# Altium footprint library mastermind.PCBLIB: 1061 footprints (part 30 of 67)
Each footprint in its own frame and in the unit in brackets; x right, y up, seen from the top. Pads: shape width x height; smd on the part's side, far side on the other; paste and mask are expansions set on the pad; w line width, h text height; cw(c..) or ccw(c..) is an arc to the next point about the centre after c.
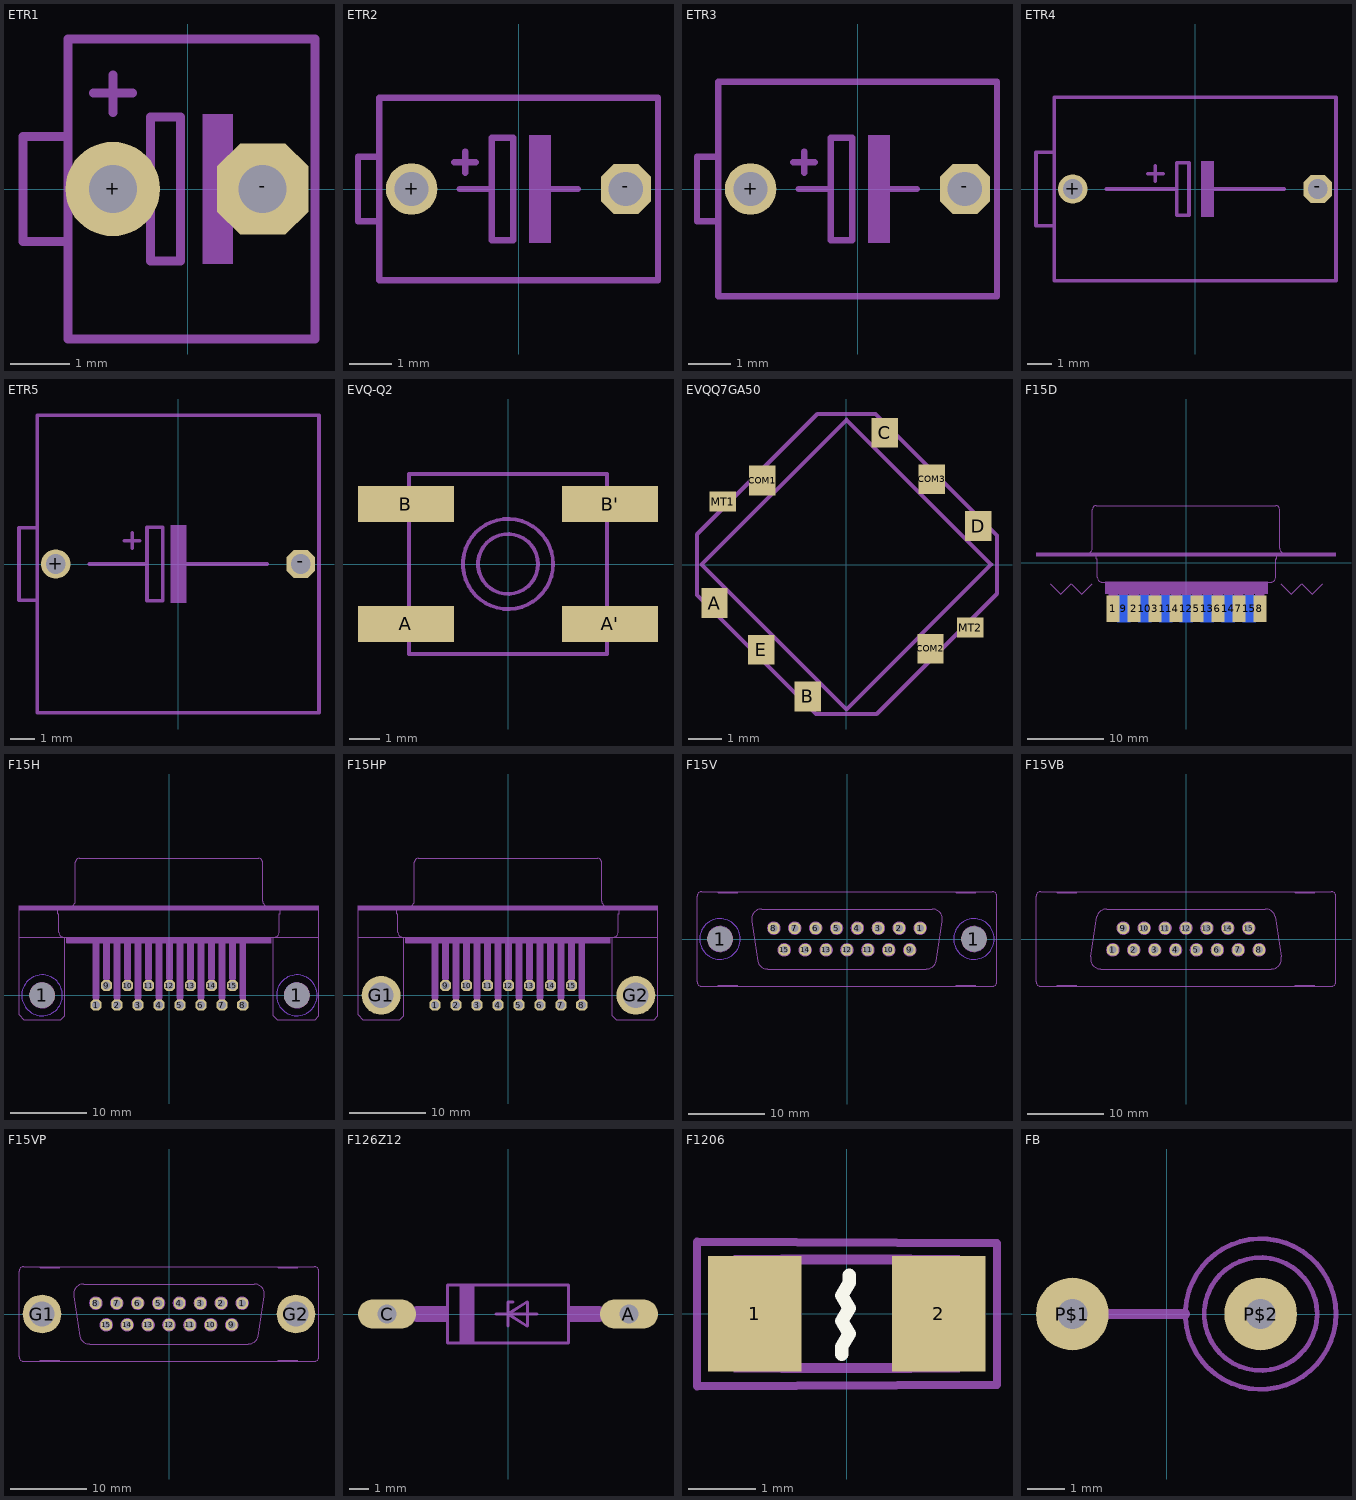
[diagram p29: the footprints below, top view; thin cyan lines are the x and y axes]

## ETR1 [mil]
pads (2):
  round 63 hole 32: +(-50,0)
  oct 61x61 hole 32: -(50,0)
Mechanical 2:
  lines w6: -63,64 -37,64 ; -50,51 -50,76 ; 85,-25 85,-100 -80,-100 -80,-35 -110,-35 -110,35 -80,35 -80,100 85,100 85,25
Mechanical 8:
  region: 10,-50 10,50 30,50 30,-50
  lines w6: -80,-35 -80,35 ; -65,0 -25,0 ; 25,0 65,0 ; 85,-25 85,25 ; -25,0 -25,48 -5,48 -5,-48 -25,-48 -25,0

## ETR2 [mil]
pads (2):
  round 48 hole 32: +(-100,0)
  oct 46.48x46.48 hole 32: -(100,0)
Mechanical 2:
  region: 10,-50 10,50 30,50 30,-50
  lines w6: -60,25 -40,25 ; -55,0 -25,0 ; -50,15 -50,35 ; 25,0 55,0 ; 130,-30 130,-85 -130,-85 -130,-30 -150,-30 -150,30 -130,30 -130,85 130,85 130,30 ; -25,0 -25,48 -5,48 -5,-48 -25,-48 -25,0
Mechanical 8:
  lines w6: -130,-30 -130,30 ; 130,-30 130,30

## ETR3 [mil]
pads (2):
  round 48 hole 32: +(-100,0)
  oct 46.48x46.48 hole 32: -(100,0)
Mechanical 2:
  region: 10,-50 10,50 30,50 30,-50
  lines w6: -60,25 -40,25 ; -55,0 -25,0 ; -50,15 -50,35 ; 25,0 55,0 ; 130,-30 130,-100 -130,-100 -130,-30 -150,-30 -150,30 -130,30 -130,100 130,100 130,30 ; -25,0 -25,48 -5,48 -5,-48 -25,-48 -25,0
Mechanical 8:
  lines w6: -130,-30 -130,30 ; 130,-30 130,30

## ETR4 [mil]
pads (2):
  round 48 hole 32: +(-200,0)
  oct 46.48x46.48 hole 32: -(200,0)
Mechanical 2:
  region: 10,-45 10,45 30,45 30,-45
  lines w6: -145,0 -30,0 ; -77,25 -52,25 ; -65,13 -65,38 ; 20,0 145,0 ; 230,-30 230,-150 -230,-150 -230,-60 -260,-60 -260,60 -230,60 -230,150 230,150 230,30 ; -30,0 -30,-43 -10,-43 -10,43 -30,43 -30,0
Mechanical 8:
  lines w6: -230,-60 -230,60 ; 230,-30 230,30

## ETR5 [mil]
pads (2):
  round 48 hole 32: +(-200,0)
  oct 46.48x46.48 hole 32: -(200,0)
Mechanical 2:
  region: -12,-63 -12,63 13,63 13,-63
  lines w6: -145,0 -51,0 ; -88,38 -63,38 ; -75,26 -75,51 ; 0,0 145,0 ; 230,-35 230,-243 -230,-243 -230,-59 -260,-59 -260,59 -230,59 -230,243 230,243 230,35 ; -51,0 -51,-60 -25,-60 -25,60 -51,60 -51,0
Mechanical 8:
  lines w6: -230,-59 -230,59 ; 230,-35 230,35

## EVQ-Q2 [mm]
pads (4):
  rect 3.2x1.2 smd: A(-3.4,-2) A'(3.4,-2) B(-3.4,2) B'(3.4,2)
Mechanical 2:
  circle w0.127: c0,0 r1.503
  circle w0.127: c0,0 r1
  lines w0.127: -3.3,-3 3.3,-3 3.3,3 -3.3,3 -3.3,-3

## EVQQ7GA50 [mil]
pads (10):
  rect 31.5x35.43 smd: A(-157.29,-45.93) B(-45.93,-157.29) C(45.93,157.29) COM1(-100.22,100.22) COM2(100.22,-100.22) COM3(101.61,101.61) D(157.29,45.93) E(-101.61,-101.61)
  rect 31.5x23.62 smd: MT1(-147.54,75.16) MT2(147.54,-75.16)
Mechanical 2:
  lines w5: -178.17,-36.19 -36.19,-178.17 36.19,-178.17 179.56,-34.8 179.56,34.8 34.8,179.56 -34.8,179.56 -178.17,36.19 -178.17,-36.19
Mechanical 29 (Mech34):
  lines w5: -172.6,0 0,-172.6 172.6,0 0,172.6 -172.6,0

## F15D [mil]
pads (15):
  rect 66.93x137.8 smd: 1(-378.01,-237.98) 2(-270,-237.99) 3(-161.99,-237.98) 4(-54.01,-237.98) 5(54.01,-237.98) 6(161.99,-237.98) 7(270,-237.99) 8(378.01,-237.98)
  rect 66.93x137.8 smd far side: 9(-324,-238) 10(-216,-238) 11(-108,-238) 12(0,-238) 13(108,-238) 14(216,-238) 15(324,-238)
Mechanical 2:
  region: -417.32,-161.42 -417.32,-98.43 417.32,-98.43 417.32,-161.42
  region: -775,31.94 -775,51.94 770,51.94 770,31.94
  lines w6: -510,48 ccw(c-510,73) -485,73 -485,273 cw(c-465,273) -465,293 460,293 cw(c460,273) 480,273 480,73 ccw(c505,73) 505,48 ; -464,40 -464,20 -459,20 -459,-75 ccw(c-434,-75) -434,-100 ; -434.76,-100 434.76,-100 ; 434,-100 ccw(c434,-75) 459,-75 459,20 464,20 464,40
Mechanical 8:
  region: 354.38,-258.27 354.38,-159.84 401.62,-159.84 401.62,-258.27
  region: 246.38,-258.27 246.38,-159.84 293.62,-159.84 293.62,-258.27
  region: 138.38,-258.27 138.38,-159.84 185.62,-159.84 185.62,-258.27
  region: 30.38,-258.27 30.38,-159.84 77.62,-159.84 77.62,-258.27
  region: -77.62,-258.27 -77.62,-159.84 -30.38,-159.84 -30.38,-258.27
  region: -185.62,-258.27 -185.62,-159.84 -138.38,-159.84 -138.38,-258.27
  region: -293.62,-258.27 -293.62,-159.84 -246.38,-159.84 -246.38,-258.27
  region: -401.62,-258.27 -401.62,-159.84 -354.38,-159.84 -354.38,-258.27
Mechanical 9:
  region: 300.38,-258.27 300.38,-159.84 347.62,-159.84 347.62,-258.27
  region: 192.38,-258.27 192.38,-159.84 239.62,-159.84 239.62,-258.27
  region: 84.38,-258.27 84.38,-159.84 131.62,-159.84 131.62,-258.27
  region: -23.62,-258.27 -23.62,-159.84 23.62,-159.84 23.62,-258.27
  region: -131.62,-258.27 -131.62,-159.84 -84.38,-159.84 -84.38,-258.27
  region: -239.62,-258.27 -239.62,-159.84 -192.38,-159.84 -192.38,-258.27
  region: -347.62,-258.27 -347.62,-159.84 -300.38,-159.84 -300.38,-258.27
Mechanical 38:
  lines w0: -702,-108 -648,-162 -594,-108 -540,-162 -486,-108 ; 486,-108 540,-162 594,-108 648,-162 702,-108

## F15H [mil]
pads (17):
  round 130 hole 130: 1(-656,0) 1(656,0)
  oct 58.09x58.09 hole 40: 1(-378,-50) 2(-270,-50) 3(-162,-50) 4(-54,-50) 5(54,-50) 6(162,-50) 7(270,-50) 8(378,-50) 9(-324,50) 10(-216,50) 11(-108,50) 12(0,50) 13(108,50) 14(216,50) 15(324,50)
Top Layer keep-out:
  circle w0: c656,0 r105
  circle w0: c-656,0 r105
Bottom Layer keep-out:
  circle w0: c656,0 r105
  circle w0: c-656,0 r105
Mechanical 2:
  circle w6: c656,0 r65
  circle w6: c-656,0 r65
  region: 362,-15 362,270 394,270 394,-15
  region: 308,85 308,270 340,270 340,85
  region: 254,-15 254,270 286,270 286,-15
  region: 200,85 200,270 232,270 232,85
  region: 146,-15 146,270 178,270 178,-15
  region: 92,85 92,270 124,270 124,85
  region: 38,-15 38,270 70,270 70,-15
  region: -16,85 -16,270 16,270 16,85
  region: -70,-15 -70,270 -38,270 -38,-15
  region: -124,85 -124,270 -92,270 -92,85
  region: -178,-15 -178,270 -146,270 -146,-15
  region: -232,85 -232,270 -200,270 -200,85
  region: -286,-15 -286,270 -254,270 -254,-15
  region: -340,85 -340,270 -308,270 -308,85
  region: -394,-15 -394,270 -362,270 -362,-15
  region: -775,440 -775,460 770,460 770,440
  region: -530,270 -530,300 525,300 525,270
  lines w6: -545,300 cw(c-545,325) -570,325 -570,420 -575,420 -575,440 ; -510,460 ccw(c-510,485) -485,485 -485,685 cw(c-465,685) -465,705 -455,705 450,705 460,705 cw(c460,685) 480,685 480,485 ccw(c505,485) 505,460 ; 540,300 ccw(c540,325) 565,325 565,420 570,420 570,440 ; -775,300 -775,295 -775,-100 -750,-125 -560,-125 -540,-105 -540,300 ; -775,300 -775,420 -775,440 ; -775,300 -575,300 -540,300 ; -775,440 -675,440 -575,440 ; -775,440 -775,460 -470,460 465,460 770,460 770,440 ; -575,440 570,440 ; -540,300 -530,300 ; -530,300 525,300 ; -530,300 -530,270 525,270 525,300 ; 525,300 535,300 ; 535,300 535,-105 555,-125 750,-125 770,-105 770,295 770,300 ; 535,300 570,300 770,300 ; 570,440 670,440 770,440 ; 770,300 770,420 770,440
Mechanical 8:
  lines w32: -378,-45 -378,-5 ; -324,55 -324,95 ; -270,-45 -270,-5 ; -216,55 -216,95 ; -162,-45 -162,-5 ; -108,55 -108,95 ; -54,-45 -54,-5 ; 0,55 0,95 ; 54,-45 54,-5 ; 108,55 108,95 ; 162,-45 162,-5 ; 216,55 216,95 ; 270,-45 270,-5 ; 324,55 324,95 ; 378,-45 378,-5

## F15HP [mil]
pads (17):
  oct 58.09x58.09 hole 40: 1(-378,-50) 2(-270,-50) 3(-162,-50) 4(-54,-50) 5(54,-50) 6(162,-50) 7(270,-50) 8(378,-50) 9(-324,50) 10(-216,50) 11(-108,50) 12(0,50) 13(108,50) 14(216,50) 15(324,50)
  round 200 hole 130: G1(-656,0) G2(656,0)
Mechanical 2:
  circle w6: c656,0 r65
  circle w6: c-656,0 r65
  region: 362,-15 362,270 394,270 394,-15
  region: 308,85 308,270 340,270 340,85
  region: 254,-15 254,270 286,270 286,-15
  region: 200,85 200,270 232,270 232,85
  region: 146,-15 146,270 178,270 178,-15
  region: 92,85 92,270 124,270 124,85
  region: 38,-15 38,270 70,270 70,-15
  region: -16,85 -16,270 16,270 16,85
  region: -70,-15 -70,270 -38,270 -38,-15
  region: -124,85 -124,270 -92,270 -92,85
  region: -178,-15 -178,270 -146,270 -146,-15
  region: -232,85 -232,270 -200,270 -200,85
  region: -286,-15 -286,270 -254,270 -254,-15
  region: -340,85 -340,270 -308,270 -308,85
  region: -394,-15 -394,270 -362,270 -362,-15
  region: -775,440 -775,460 770,460 770,440
  region: -530,270 -530,300 525,300 525,270
  lines w6: -545,300 cw(c-545,325) -570,325 -570,420 -575,420 -575,440 ; -510,460 ccw(c-510,485) -485,485 -485,685 cw(c-465,685) -465,705 -455,705 450,705 460,705 cw(c460,685) 480,685 480,485 ccw(c505,485) 505,460 ; 540,300 ccw(c540,325) 565,325 565,420 570,420 570,440 ; -775,300 -775,295 -775,-100 -750,-125 -560,-125 -540,-105 -540,300 ; -775,300 -775,420 -775,440 ; -775,300 -575,300 -540,300 ; -775,440 -675,440 -575,440 ; -775,440 -775,460 -470,460 465,460 770,460 770,440 ; -575,440 570,440 ; -540,300 -530,300 ; -530,300 525,300 ; -530,300 -530,270 525,270 525,300 ; 525,300 535,300 ; 535,300 535,-105 555,-125 750,-125 770,-105 770,295 770,300 ; 535,300 570,300 770,300 ; 570,440 670,440 770,440 ; 770,300 770,420 770,440
Mechanical 8:
  lines w32: -378,-45 -378,-5 ; -324,55 -324,95 ; -270,-45 -270,-5 ; -216,55 -216,95 ; -162,-45 -162,-5 ; -108,55 -108,95 ; -54,-45 -54,-5 ; 0,55 0,95 ; 54,-45 54,-5 ; 108,55 108,95 ; 162,-45 162,-5 ; 216,55 216,95 ; 270,-45 270,-5 ; 324,55 324,95 ; 378,-45 378,-5

## F15V [mil]
pads (17):
  round 130 hole 130: 1(-656,0) 1(656,0)
  oct 58.09x58.09 hole 40: 1(378,56) 2(270,56) 3(162,56) 4(54,56) 5(-54,56) 6(-162,56) 7(-270,56) 8(-378,56) 9(324,-56) 10(216,-56) 11(108,-56) 12(0,-56) 13(-108,-56) 14(-216,-56) 15(-324,-56)
Top Layer keep-out:
  circle w0: c656,0 r105
  circle w0: c-656,0 r105
Bottom Layer keep-out:
  circle w0: c656,0 r105
  circle w0: c-656,0 r105
Mechanical 2:
  circle w6: c-656,0 r65
  circle w6: c656,0 r65
  lines w6: -492,92 -461,-116 ; -491.97,91.61 cw(c-440,102) -440,155 440,155 cw(c440,101.99) 491.79,90.7 ; -461.3,-115.33 ccw(c-410,-101.99) -410,-155 410,-155 ccw(c409.99,-102) 461.52,-114.37 ; 461,-115 492,91 ; -665,-245 -665,-240 -565,-240 -565,-245 ; -665,-245 -565,-245 ; -665,-245 -750,-245 cw(c-750,-220) -775,-220 -775,220 cw(c-750,220) -750,245 -665,245 ; -665,245 -665,240 -565,240 -565,245 ; -665,245 -565,245 ; -565,-245 565,-245 ; -565,245 565,245 ; 565,-245 565,-240 665,-240 665,-245 ; 565,-245 665,-245 ; 565,245 565,240 665,240 665,245 ; 565,245 665,245 ; 665,-245 750,-245 ccw(c750,-220) 775,-220 775,220 ccw(c750,220) 750,245 665,245
Mechanical 8:
  circle w10: c108,-56 r30
  circle w10: c162,56 r30
  circle w10: c216,-56 r30
  circle w10: c270,56 r30
  circle w10: c54,56 r30
  circle w10: c0,-56 r30
  circle w10: c-54,56 r30
  circle w10: c-108,-56 r30
  circle w10: c-162,56 r30
  circle w10: c378,56 r30
  circle w10: c324,-56 r30
  circle w10: c-270,56 r30
  circle w10: c-378,56 r30
  circle w10: c-216,-56 r30
  circle w10: c-324,-56 r30

## F15VB [mil]
pads (15):
  oct 58.09x58.09 hole 40: 1(-378,-56) 2(-270,-56) 3(-162,-56) 4(-54,-56) 5(54,-56) 6(162,-56) 7(270,-56) 8(378,-56) 9(-324,56) 10(-216,56) 11(-108,56) 12(0,56) 13(108,56) 14(216,56) 15(324,56)
Mechanical 2:
  lines w6: -492,-91 -461,115 ; -491.79,-90.7 ccw(c-440,-101.99) -440,-155 440,-155 ccw(c440,-102) 491.97,-91.61 ; -461.52,114.37 cw(c-409.99,102) -410,155 410,155 cw(c410,101.99) 461.3,115.33 ; 461,116 492,-92 ; -665,-245 -750,-245 cw(c-750,-220) -775,-220 -775,220 cw(c-750,220) -750,245 -665,245 ; -665,-245 -665,-240 -565,-240 -565,-245 ; -665,-245 -565,-245 ; -665,245 -565,245 ; -665,245 -665,240 -565,240 -565,245 ; -565,-245 565,-245 ; -565,245 565,245 ; 565,-245 565,-240 665,-240 665,-245 ; 565,-245 665,-245 ; 565,245 665,245 ; 565,245 565,240 665,240 665,245 ; 665,-245 750,-245 ccw(c750,-220) 775,-220 775,220 ccw(c750,220) 750,245 665,245
Mechanical 8:
  circle w10: c-108,56 r30
  circle w10: c-162,-56 r30
  circle w10: c-216,56 r30
  circle w10: c-270,-56 r30
  circle w10: c-54,-56 r30
  circle w10: c0,56 r30
  circle w10: c54,-56 r30
  circle w10: c108,56 r30
  circle w10: c162,-56 r30
  circle w10: c-378,-56 r30
  circle w10: c-324,56 r30
  circle w10: c270,-56 r30
  circle w10: c378,-56 r30
  circle w10: c216,56 r30
  circle w10: c324,56 r30

## F15VP [mil]
pads (17):
  oct 58.09x58.09 hole 40: 1(378,56) 2(270,56) 3(162,56) 4(54,56) 5(-54,56) 6(-162,56) 7(-270,56) 8(-378,56) 9(324,-56) 10(216,-56) 11(108,-56) 12(0,-56) 13(-108,-56) 14(-216,-56) 15(-324,-56)
  round 200 hole 130: G1(-656,0) G2(656,0)
Mechanical 2:
  circle w6: c-656,0 r65
  circle w6: c656,0 r65
  lines w6: -492,92 -461,-116 ; -491.97,91.61 cw(c-440,102) -440,155 440,155 cw(c440,101.99) 491.79,90.7 ; -461.3,-115.33 ccw(c-410,-101.99) -410,-155 410,-155 ccw(c409.99,-102) 461.52,-114.37 ; 461,-115 492,91 ; -665,-245 -665,-240 -565,-240 -565,-245 ; -665,-245 -565,-245 ; -665,-245 -750,-245 cw(c-750,-220) -775,-220 -775,220 cw(c-750,220) -750,245 -665,245 ; -665,245 -665,240 -565,240 -565,245 ; -665,245 -565,245 ; -565,-245 565,-245 ; -565,245 565,245 ; 565,-245 565,-240 665,-240 665,-245 ; 565,-245 665,-245 ; 565,245 565,240 665,240 665,245 ; 565,245 665,245 ; 665,-245 750,-245 ccw(c750,-220) 775,-220 775,220 ccw(c750,220) 750,245 665,245
Mechanical 8:
  circle w10: c108,-56 r30
  circle w10: c162,56 r30
  circle w10: c216,-56 r30
  circle w10: c270,56 r30
  circle w10: c54,56 r30
  circle w10: c0,-56 r30
  circle w10: c-54,56 r30
  circle w10: c-108,-56 r30
  circle w10: c-162,56 r30
  circle w10: c378,56 r30
  circle w10: c324,-56 r30
  circle w10: c-270,56 r30
  circle w10: c-378,56 r30
  circle w10: c-216,-56 r30
  circle w10: c-324,-56 r30

## F126Z12 [mil]
pads (2):
  oval 120x60 hole 40: A(250,0) C(-250,0)
Mechanical 2:
  region: -100,-60 -100,60 -70,60 -70,-60
  region: -191,-16 -191,16 -125,16 -125,-16
  region: 125,-16 125,16 191,16 191,-16
  lines w6: -25,0 0,0 ; 0,-25 0,0 ; 10,25 0,25 0,0 ; 60,0 0,0 ; 0,0 40,-25 40,25 0,0 ; -125,-60 125,-60 125,60 -125,60 -125,-60
Mechanical 8:
  lines w32: -250,0 -190,0 ; 190,0 250,0

## F1206 [mm]
height 0.7
pads (2):
  rect 1.4x1.72 smd: 1(-1.376,0) 2(1.376,0)
Top Overlay:
  lines w0.2: -0.075,-0.604 -0.075,-0.49 0.039,-0.299 -0.075,-0.109 0.039,0.082 -0.075,0.272 0.039,0.463 0.039,0.577
Dimensions:
  region: -1.689,-0.876 -1.689,0.876 -0.953,0.876 -0.953,-0.876
  region: 0.953,-0.876 0.953,0.876 1.689,0.876 1.689,-0.876
  lines w0.152: -0.965,-0.813 0.953,-0.813 ; -0.965,0.813 0.953,0.813
  text ".Designator" at 2.076,0.224 h0.61
Mechanical 15:
  lines w0.127: -2.238,-1.082 2.246,-1.06 2.246,1.055 -2.238,1.074 -2.238,-1.082
3D body "0ZCJ0035FF2G.step": height 0.51, standoff 0.01, extent -1.7,-0.85 1.7,0.85

## FB [mil]
pads (2):
  round 76 hole 31.5: P$1(-98.43,0) P$2(98.43,0)
Mechanical 2:
  circle w5: c98.43,0 r59.06
  circle w5: c98.43,0 r78.74
  lines w10: -59.06,0 19.69,0